# Altium footprint library 3.10-变压器.PcbLib: 33 footprints (part 3 of 3)
Each footprint in its own frame and in the unit in brackets; x right, y up, seen from the top. Pads: shape width x height; smd on the part's side, far side on the other; paste and mask are expansions set on the pad; w line width, h text height; cw(c..) or ccw(c..) is an arc to the next point about the centre after c.
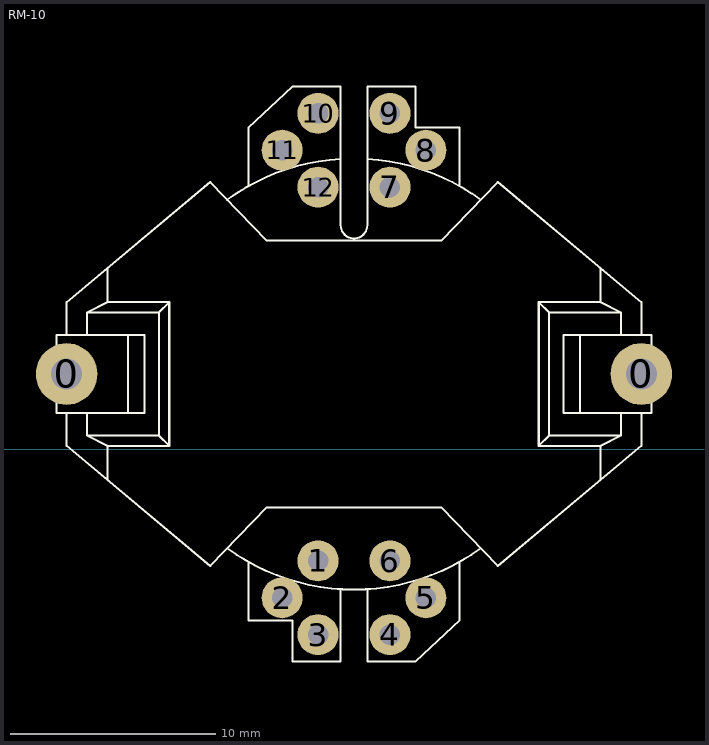
[diagram p2: the footprint, top view; thin cyan lines are the x and y axes]

## RM-10 [mm] "封装库来自淘宝卖家 ID：黄晶宝石"
pads (14):
  round 3 hole 1.5: 0(12.044,3.671) 0(40.044,3.671)
  round 2 hole 1: 1(24.294,-5.429) 2(22.544,-7.229) 3(24.294,-9.029) 4(27.794,-9.029) 5(29.544,-7.229) 6(27.794,-5.429) 7(27.794,12.771) 8(29.544,14.571) 9(27.794,16.371) 10(24.294,16.371) 11(22.544,14.571) 12(24.294,12.771)
Top Overlay:
  lines w0.1: 12.044,1.754 12.044,0.171 19.044,-5.679 21.794,-2.829 30.294,-2.829 33.044,-5.679 40.044,0.171 40.044,1.754 ; 12.044,5.575 12.044,7.171 19.044,13.021 21.794,10.171 30.294,10.171 33.044,13.021 40.044,7.171 40.044,5.575 ; 13.044,1.754 13.044,0.671 ; 13.044,5.576 13.044,6.671 ; 14.044,-1.481 14.044,0.171 ; 14.044,8.837 14.044,7.171 ; 15.044,1.771 15.044,5.571 ; 19.857,12.155 cw(c26.044,3.671) 25.394,14.151 ; 19.871,-4.823 ccw(c26.044,3.671) 32.217,-4.823 ; 20.894,-5.482 20.894,-8.329 23.044,-8.329 23.044,-10.329 25.394,-10.329 25.394,-6.82 ; 20.894,12.831 20.894,15.671 23.044,17.671 25.394,17.671 25.394,10.92 ccw(c26.044,10.92) 26.694,10.92 26.694,17.671 29.044,17.671 29.044,15.671 31.194,15.671 31.194,12.832 ; 26.694,-6.818 26.694,-10.329 29.044,-10.329 31.194,-8.329 31.194,-5.482 ; 26.696,14.151 cw(c26.044,3.671) 32.217,12.165 ; 37.044,1.771 37.044,5.571 ; 38.044,-1.481 38.044,0.171 ; 38.044,8.837 38.044,7.171 ; 39.044,1.754 39.044,0.671 ; 39.044,5.576 39.044,6.671 ; 13.044,0.671 14.044,0.171 ; 13.044,0.671 16.544,0.671 ; 13.044,6.671 14.044,7.171 ; 13.044,6.671 16.544,6.671 ; 14.044,0.171 17.044,0.171 ; 14.044,7.171 17.044,7.171 ; 16.544,0.671 17.044,0.171 ; 16.544,0.671 16.544,6.671 ; 16.544,6.671 17.044,7.171 ; 17.044,0.171 17.044,7.171 ; 35.044,0.171 35.044,7.171 ; 35.044,0.171 38.044,0.171 ; 35.044,0.171 35.544,0.671 ; 35.044,7.171 38.044,7.171 ; 35.044,7.171 35.544,6.671 ; 35.544,0.671 39.044,0.671 ; 35.544,0.671 35.544,6.671 ; 35.544,6.671 39.044,6.671 ; 38.044,0.171 39.044,0.671 ; 38.044,7.171 39.044,6.671 ; 11.544,1.771 15.844,1.771 15.844,5.571 11.544,5.571 11.544,1.771 ; 36.244,1.771 36.244,5.571 40.544,5.571 40.544,1.771 36.244,1.771
3D body: height 16.5, standoff -3.4, extent 11.794,-10.701 40.294,18.043
3D body: height 13.5, standoff 3, extent 16.083,-6.309 36.005,13.651